# Altium schematic symbol library BARKO_SCHLIB.SchLib: 1064 symbols (part 10 of 11) (continued)
## R-150R-1206 (continued)
RES SMD 150 OHM 1% 1/4W 1206; Manufacturer: Stackpole Electronics; Manufacturer Part Number: RMCF1206FT150R; .PCBCHK: USED; .Creator: F:TALI; Washability: OK; Max Power Dissipation: 250mW; Temperature Coefficient: 100ppm/°C; ComponentLink1URL: http://www.vishay.com/docs/20008/dcrcw.pdf; ComponentLink1Description: http://www.vishay.com/docs/20008/dcrcw.pdf; ComponentLink2URL: http://documents.rs-components.com/techlib://itc_doclist_GB.htm?stockno=6180281; ComponentLink2Description: http://documents.rs-components.com/techlib://itc_doclist_GB.htm?stockno=6180281; ComponentLink3URL: http://www.farnell.com/datasheets/444357.pdf; ComponentLink3Description: http://www.farnell.com/datasheets/444357.pdf; ComponentLink4URL: http://www.farnell.com/datasheets/426256.pdf; ComponentLink4Description: http://www.farnell.com/datasheets/426256.pdf; ComponentLink5URL: http://www.mouser.com/ds/2/315/AOA0000C283-1093288.pdf; ComponentLink5Description: http://www.mouser.com/ds/2/315/AOA0000C283-1093288.pdf; ComponentLink6URL: http://www.farnell.com/datasheets/1678782.pdf; ComponentLink6Description: http://www.farnell.com/datasheets/1678782.pdf; ComponentLink7URL: http://industrial.panasonic.com/www-data/pdf/AOA0000/AOA0000CE2.pdf; ComponentLink7Description: http://industrial.panasonic.com/www-data/pdf/AOA0000/AOA0000CE2.pdf; ComponentLink8URL: https://www.alliedelec.com/m/d/623f45ff1957d936ff56d46fd1c28cac.pdf; ComponentLink8Description: https://www.alliedelec.com/m/d/623f45ff1957d936ff56d46fd1c28cac.pdf; .SCHCHK: USED; Supplier 1: Digi-Key; Supplier Part Number 1: RMCF1206FT150RCT-ND; Stock: 77607; Pricing: 1=0.1, 10=0.031, 100=0.0127, 1000=0.0057, 2500=0.0049 (USD); RoHS: Yes; Mount: Surface Mount; Case/Package: 1206; Contact Plating: Tin,Matte; Case Code (Metric): 3216; Min Operating Temperature: -55°C; Max Operating Temperature: 155°C; Resistor Type: Thick Film; Number of Terminations: 2; Tolerance: 1%; Packaging: Tape and Reel; Resistance: 150R; Features: Automotive AEC-Q200; Length: 0.126inch; Height: 0.028inch; Depth: 1.6mm; Width: 0.063inch; Radiation Hardening: No; Military Standard: Not; ComponentLink9URL: http://components.arrow.com/part/dataview/44988367S7171880N1174?src-supplier=Arrow+Electronics; ComponentLink9Description: http://components.arrow.com/part/dataview/44988367S7171880N1174?src-supplier=Arrow+Electronics; ComponentLink10URL: https://www.seielect.com/Catalog/SEI-RMCF_RMCP.pdf?src-supplier=Digi-Key; ComponentLink10Description: https://www.seielect.com/Catalog/SEI-RMCF_RMCP.pdf?src-supplier=Digi-Key; ComponentLink11URL: https://www.seielect.com/catalog/SEI-Packaging.pdf?src-supplier=Digi-Key; ComponentLink11Description: https://www.seielect.com/catalog/SEI-Packaging.pdf?src-supplier=Digi-Key; ComponentLink12URL: https://www.seielect.com/catalog/SEI-RMCF_RMCP.pdf?src-supplier=Avnet; ComponentLink12Description: https://www.seielect.com/catalog/SEI-RMCF_RMCP.pdf?src-supplier=Avnet; ComponentLink13URL: https://www.verical.com/server-webapp/html/getDatasheet?partID=366466&src-supplier=Verical; ComponentLink13Description: https://www.verical.com/server-webapp/html/getDatasheet?partID=366466&src-supplier=Verical
footprint R-1206
pins: 1, 2

## R-180R-0603
designator R?, comment 180R  Case Code (Imperial): 0603
RES SMD 180 OHM 1% 1/8W 0603; Manufacturer: Stackpole Electronics; Manufacturer Part Number: RNCP0603FTD180R; Max Power Dissipation: 125mW; Temperature Coefficient: 100ppm/°C; .PCBCHK: USED; .Creator: F:TALI; Washability: OK; Stock 1: 2901; Pricing 1: 1=0.1, 10=0.067, 100=0.0273, 1000=0.01224, 2500=0.01063 (USD); Mount: Surface Mount; Case/Package: 0603; Case Code (Metric): 1608; Min Operating Temperature: -55°C; Max Operating Temperature: 155°C; Resistance: 180R; Tolerance: 1%; Packaging: Tape and Reel; Composition: Thin Film; Number of Terminations: 2; Features: Anti-Sulfur,Moisture Resistant; Length: 0.059inch; Height: 0.02inch; Width: 0.031inch; Stock 2: 19504; Pricing 2: 1=0.18, 10=0.152, 100=0.0596, 1000=0.02495, 2500=0.02287 (USD); Contact Plating: Tin; Package Quantity: 5000; Military Standard: Not; Depth: 0.85mm; Radiation Hardening: No; Lead Free: Lead Free; ComponentLink1URL: http://www.vishay.com/docs/28705/mc_pro.pdf; ComponentLink1Description: http://www.vishay.com/docs/28705/mc_pro.pdf; .SCHCHK: USED; Supplier 1: Digi-Key; Supplier Part Number 1: RNCP0603FTD180RDKR-ND
footprint R-0603
pins: 1, 2

## R-182K-0603
designator R?, comment 180K  Case Code (Imperial): 0603
RES SMD 182K OHM 1% 1/10W 0603; Manufacturer: Panasonic; Manufacturer Part Number: ERJ-3EKF1823V; Resistance: 182kR; Temperature Coefficient: 100ppm/°C; Max Power Dissipation: 100mW; Voltage Rating (DC): 50V; Voltage Rating: 75V; .PCBCHK: USED; .Creator: F:TALI; Washability: OK; Stock 1: 134551; Pricing 1: 1=0.1, 10=0.065, 100=0.0264, 1000=0.01186, 2500=0.01029 (USD); Mount: Surface Mount; Case/Package: 0603; Case Code (Metric): 1608; Contact Plating: Tin; Min Operating Temperature: -55°C; Max Operating Temperature: 155°C; Tolerance: 1%; Packaging: Tape and Reel; Package Quantity: 1; Composition: Thick Film; Number of Terminations: 2; Features: Automotive AEC-Q200; Power Rating: 100mW; Military Standard: Not; Termination: SMD/SMT; Length: 1.6mm; Height: 0.022inch; Width: 0.031inch; Depth: 0.8mm; Lead Free: Lead Free; REACH SVHC: No SVHC; ComponentLink1URL: http://www.mouser.com/ds/2/315/AOA0000CE2-37512.pdf; ComponentLink1Description: http://www.mouser.com/ds/2/315/AOA0000CE2-37512.pdf; ComponentLink2URL: http://www.farnell.com/datasheets/1911175.pdf; ComponentLink2Description: http://www.farnell.com/datasheets/1911175.pdf; ComponentLink3URL: https://www.alliedelec.com/m/d/623f45ff1957d936ff56d46fd1c28cac.pdf; ComponentLink3Description: https://www.alliedelec.com/m/d/623f45ff1957d936ff56d46fd1c28cac.pdf; ComponentLink4URL: http://www.farnell.com/datasheets/426256.pdf; ComponentLink4Description: http://www.farnell.com/datasheets/426256.pdf; ComponentLink5URL: http://www.farnell.com/datasheets/1678782.pdf; ComponentLink5Description: http://www.farnell.com/datasheets/1678782.pdf; Stock 2: 550; Pricing 2: 1=0.1, 10=0.011, 100=0.0043 (USD); ComponentLink6URL: http://rohmfs.rohm.com/en/products/databook/datasheet/passive/resistor/chip_resistor/mcr_g.pdf; ComponentLink6Description: http://rohmfs.rohm.com/en/products/databook/datasheet/passive/resistor/chip_resistor/mcr_g.pdf; Stock 3: 0; Pricing 3: 1=0.1, 10=0.026, 100=0.0107, 1000=0.00478, 2500=0.00415 (USD); ComponentLink7URL: http://www.yageo.com/documents/recent/PYu-RC_Group_51_RoHS_L_9.pdf; ComponentLink7Description: http://www.yageo.com/documents/recent/PYu-RC_Group_51_RoHS_L_9.pdf; ComponentLink8URL: https://www.verical.com/server-webapp/html/getDatasheet?partID=328148; ComponentLink8Description: https://www.verical.com/server-webapp/html/getDatasheet?partID=328148; ComponentLink9URL: http://www.mouser.com/catalog/specsheets/RC0603.pdf; ComponentLink9Description: http://www.mouser.com/catalog/specsheets/RC0603.pdf; .SCHCHK: USED; Supplier 1: Digi-Key; Supplier Part Number 1: P182KHDKR-ND
footprint R-0603
pins: 1, 2

## R-200K-0603
designator R?, comment 200K  Tolerance: 1%  Case/Package: 0603
RES 200K OHM 1% 1/10W 0603; Manufacturer: Stackpole Electronics; Manufacturer Part Number: RMCF0603FT200K; Temperature Coefficient: 100ppm/°C; Resistance: 200kR; Power Rating: 100mW; Supplier 1: Digi-Key; Supplier Part Number 1: RMCF0603FT200KCT-ND; Stock: 196828; Pricing: 1=0.1, 10=0.015, 100=0.0063, 1000=0.0028, 2500=0.0024 (USD); RoHS: Yes; Mount: Surface Mount; Case Code (Imperial): 0603; Contact Plating: Tin,Matte; Min Operating Temperature: -55°C; Max Operating Temperature: 155°C; Composition: Thick Film; Number of Terminations: 2; Military Standard: Not; Packaging: Tape and Reel; Features: Automotive AEC-Q200; Max Power Dissipation: 100mW; Length: 1.55mm; Height: 0.022inch; Depth: 0.8mm; Width: 0.031inch; Radiation Hardening: No; Lead Free: Lead Free; ComponentLink1URL: https://datasheet.ciiva.com/15193/getdatasheetpartid-369944-15193452.pdf?src-supplier=Verical; ComponentLink1Description: https://datasheet.ciiva.com/15193/getdatasheetpartid-369944-15193452.pdf?src-supplier=Verical; Case Code (Metric): 1608
footprint R-0603
pins: 1, 2

## R-200K-0805
designator R?, comment 200K  Case/Package: 0805
RES 200K OHM 1% 1/8W 0805; Manufacturer 1: Stackpole Electronics; Manufacturer Part Number: RMCF0805FT200K; Working Voltage: 150V; Resistance: 200kR; Power Rating: 125mW; Temperature Coefficient: 100ppm/°C; .Creator: M.OZKAN; .PCBCHK: USED; Supplier 1: Digi-Key; Supplier Part Number 1: RMCF0805FT200KCT-ND; RoHS: Yes; Category: Chip SMD Resistors; Stock: 131806; Pricing: 1=0,10000, 10=0,02600, 100=0,01040, 1000=0,00466, 2500=0,00405 (USD); Mount: Surface Mount; Case Code (Imperial): 0805; Case Code (Metric): 2012; Contact Plating: Tin,Matte; Min Operating Temperature: -55°C; Max Operating Temperature: 155°C; Composition: Thick Film; Number of Terminations: 2; Military Standard: Not; Packaging: Tape and Reel; Features: Automotive AEC-Q200; Tolerance: 1%; Max Power Dissipation: 125mW; Length: 2mm; Height: 0.026inch; Depth: 1.25mm; Width: 0.049inch; Radiation Hardening: No; Lead Free: Lead Free; ComponentLink1URL: http://components.arrow.com/part/dataview/43746279S7171769N1174?src-supplier=Arrow; ComponentLink1Description: http://components.arrow.com/part/dataview/43746279S7171769N1174?src-supplier=Arrow; ComponentLink2URL: https://www.verical.com/server-webapp/html/getDatasheet?partID=364258&src-supplier=Verical; ComponentLink2Description: https://www.verical.com/server-webapp/html/getDatasheet?partID=364258&src-supplier=Verical; ComponentLink3URL: http://www.seielect.com/Catalog/SEI-RMC.pdf?src-supplier=Future+Electronics; ComponentLink3Description: http://www.seielect.com/Catalog/SEI-RMC.pdf?src-supplier=Future+Electronics; ComponentLink4URL: https://www.seielect.com/catalog/SEI-Packaging.pdf?src-supplier=Digi-Key; ComponentLink4Description: https://www.seielect.com/catalog/SEI-Packaging.pdf?src-supplier=Digi-Key; ComponentLink5URL: https://www.seielect.com/catalog/SEI-RMCF_RMCP.pdf?src-supplier=Avnet; ComponentLink5Description: https://www.seielect.com/catalog/SEI-RMCF_RMCP.pdf?src-supplier=Avnet; .SCHCHK: USED
footprint R-0805
pins: 1, 2

## R-200U-3920
designator R?, comment 200U  Tolerance: 1%  Case/Package: 3920
RES SMD 200 UOHM 1% 12W 3920; Manufacturer: Bourns; Manufacturer Part Number: CSS2H-3920R-L200F; Resistance: 0.2mR; Temperature Coefficient: 50ppm/°C; Supplier 1: Digi-Key; Supplier Part Number 1: CSS2H-3920R-L200FCT-ND; Stock: 8453; Pricing: 1=1.52, 10=1.342, 25=1.234, 50=1.1258, 100=0.9743, 250=0.8227, 500=0.6928, 1000=0.5889 (USD); RoHS: Yes; Case Code (Metric): 1052; Case Code (Imperial): 3920; Min Operating Temperature: -55°C; Max Operating Temperature: 170°C; Number of Terminations: 2; Max Power Dissipation: 12W; Features: Moisture Resistant; Packaging: Cut Tape; Power Rating: 12W; Resistor Type: Metal Element,Metal Strip; Length: 0.394inch; Height: 0.051inch; Width: 0.205inch; REACH SVHC: No SVHC; ComponentLink1URL: http://www.farnell.com/datasheets/2058209.pdf?src-supplier=Farnell; ComponentLink1Description: http://www.farnell.com/datasheets/2058209.pdf?src-supplier=Farnell; ComponentLink2URL: http://www.mouser.com/ds/2/54/ss2h-3920-935112.pdf?src-supplier=Mouser; ComponentLink2Description: http://www.mouser.com/ds/2/54/ss2h-3920-935112.pdf?src-supplier=Mouser; ComponentLink3URL: http://www.farnell.com/datasheets/2058209.pdf?src-supplier=Element14; ComponentLink3Description: http://www.farnell.com/datasheets/2058209.pdf?src-supplier=Element14; ComponentLink4URL: http://www.bourns.com/docs/Product-Datasheets/css2h-3920.pdf?src-supplier=Digi-Key; ComponentLink4Description: http://www.bourns.com/docs/Product-Datasheets/css2h-3920.pdf?src-supplier=Digi-Key; ComponentLink5URL: https://www.bourns.com/docs/Product-Datasheets/css2h-3920.pdf?src-supplier=Digi-Key; ComponentLink5Description: https://www.bourns.com/docs/Product-Datasheets/css2h-3920.pdf?src-supplier=Digi-Key
footprint R-3920
pins: 1, 2

## R-210K-0603
designator R?, comment 210K  Tolerance: 1%  Case/Package: 0603
RES 210K OHM 1% 1/10W 0603; Manufacturer: Stackpole Electronics; Manufacturer Part Number: RMCF0603FT210K; Resistance: 210kR; Temperature Coefficient: 100ppm/°C; Max Power Dissipation: 100mW; Washability: OK; .Creator: M.OZKAN; .PCBCHK: USED; RoHS: Yes; Mount: Surface Mount; Case Code (Metric): 1608; Case Code (Imperial): 0603; Contact Plating: Tin,Matte; Min Operating Temperature: -55°C; Max Operating Temperature: 155°C; Composition: Thick Film; Packaging: Tape and Reel; Number of Terminations: 2; Features: Automotive AEC-Q200; Power Rating: 100mW; Package Quantity: 1; Length: 0.061inch; Height: 0.022inch; Width: 0.031inch; Radiation Hardening: No; Lead Free: Lead Free; ComponentLink1URL: http://www.seielect.com/Catalog/SEI-RMC.pdf?src-supplier=Future+Electronics; ComponentLink1Description: http://www.seielect.com/Catalog/SEI-RMC.pdf?src-supplier=Future+Electronics; ComponentLink2URL: https://www.seielect.com/catalog/SEI-Packaging.pdf?src-supplier=Digi-Key; ComponentLink2Description: https://www.seielect.com/catalog/SEI-Packaging.pdf?src-supplier=Digi-Key; ComponentLink3URL: https://www.seielect.com/catalog/SEI-RMCF_RMCP.pdf?src-supplier=Avnet; ComponentLink3Description: https://www.seielect.com/catalog/SEI-RMCF_RMCP.pdf?src-supplier=Avnet; Supplier 1: Avnet; Supplier Part Number 1: RMCF0603FT40K2; Stock 1: 0; Pricing 1: 65000=0.00184, 75000=0.00182, 140000=0.00177, 325000=0.00173, 650000=0.00169 (USD); ComponentLink4URL: http://components.arrow.com/part/dataview/47804758S9848883N1174?src-supplier=Arrow; ComponentLink4Description: http://components.arrow.com/part/dataview/47804758S9848883N1174?src-supplier=Arrow; ComponentLink5URL: https://www.seielect.com/catalog/SEI-RMCF_RMCP.pdf?src-supplier=Avnet+Asia; ComponentLink5Description: https://www.seielect.com/catalog/SEI-RMCF_RMCP.pdf?src-supplier=Avnet+Asia; .SCHCHK: USED
footprint R-0603
pins: 1, 2

## R-215R-0603-0.1
designator R?, comment 215R  Case/Package: 0603  Tolerance: 0.1%
RES SMD 215 OHM 0.1% 1/5W 0603; Manufacturer: Panasonic; Manufacturer Part Number: ERJ-PB3B2150V; Max Power Dissipation: 200mW; Temperature Coefficient: 50ppm/°C; Supplier 1: Digi-Key; Supplier Part Number 1: P19893CT-ND; Stock: 4851; Pricing: 1=0.23, 10=0.191, 25=0.1392, 50=0.101, 100=0.0748, 250=0.0574, 500=0.0452, 1000=0.0313 (USD); RoHS: Yes; Case Code (Imperial): 0603; Case Code (Metric): 1608; Min Operating Temperature: -55°C; Max Operating Temperature: 155°C; Packaging: Tape and Reel; Resistance: 215R; Resistor Type: Thick Film; Number of Terminations: 2; Features: Automotive AEC-Q200; Length: 0.063inch; Width: 0.032inch; Height - Seated (Max): 0.022inch; ComponentLink1URL: https://industrial.panasonic.com/cdbs/www-data/pdf/RDM0000/DMM0000COL5.pdf?src-supplier=Digi-Key; ComponentLink1Description: https://industrial.panasonic.com/cdbs/www-data/pdf/RDM0000/DMM0000COL5.pdf?src-supplier=Digi-Key; ComponentLink2URL: https://industrial.panasonic.com/sa/system/files/data/download/catalog/id_fixed-resistors_e_2.pdf?src-supplier=Digi-Key; ComponentLink2Description: https://industrial.panasonic.com/sa/system/files/data/download/catalog/id_fixed-resistors_e_2.pdf?src-supplier=Digi-Key
footprint R-0603
pins: 1, 2

## R-220K-0402
designator R?, comment 220K  Case/Package: 0402
RES SMD 220K OHM 1% 1/10W 0402; Manufacturer: Vishay BCcomponents; Manufacturer Part Number: MCS04020C2203FE000; Resistance: 270R; Temperature Coefficient: 50ppm/°C; Max Power Dissipation: 100mW; Voltage Rating: 50V; .PCBCHK: USED; .Creator: F:TALI; Washability: OK; Stock 1: 60942; Pricing 1: 1=0.3, 10=0.254, 100=0.0993, 1000=0.04158, 2500=0.03812, 5000=0.03465 (USD); Contact Plating: Tin; Min Operating Temperature: -55°C; Max Operating Temperature: 125°C; Tolerance: 1%; Composition: Thin Film; Packaging: Tape and Reel; Military Standard: Not; Length: 1mm; Width: 500um; Depth: 0.5mm; Radiation Hardening: No; Lead Free: Lead Free; ComponentLink1URL: http://www.vishay.com/docs/28705/mc_pro.pdf; ComponentLink1Description: http://www.vishay.com/docs/28705/mc_pro.pdf; Stock 2: 1223696; Pricing 2: 1=0.1, 10=0.031, 100=0.0125, 1000=0.0056, 2500=0.00486, 5000=0.00401 (USD); Mount: Surface Mount; Case Code (Imperial): 0402; Case Code (Metric): 1005; Package Quantity: 1; Number of Terminations: 2; Power Rating: 100mW; Features: Automotive AEC-Q200; Voltage Rating (DC): 50V; Termination: SMD/SMT; Height: 0.35mm; REACH SVHC: No SVHC; ComponentLink2URL: http://www.farnell.com/datasheets/1500035.pdf; ComponentLink2Description: http://www.farnell.com/datasheets/1500035.pdf; ComponentLink3URL: http://www.mouser.com/ds/2/315/AOA0000C84-947596.pdf; ComponentLink3Description: http://www.mouser.com/ds/2/315/AOA0000C84-947596.pdf; ComponentLink4URL: https://www.alliedelec.com/m/d/51cd0790071e1666bdb9d00c57fcf960.pdf; ComponentLink4Description: https://www.alliedelec.com/m/d/51cd0790071e1666bdb9d00c57fcf960.pdf; ComponentLink5URL: http://industrial.panasonic.com/www-data/pdf/AOA0000/AOA0000CE1.pdf; ComponentLink5Description: http://industrial.panasonic.com/www-data/pdf/AOA0000/AOA0000CE1.pdf; Stock 3: 15182; Pricing 3: 1=0.15, 10=0.125, 100=0.0491, 1000=0.02053, 2500=0.01882, 5000=0.01711 (USD); ComponentLink6URL: http://www.farnell.com/datasheets/1678782.pdf; ComponentLink6Description: http://www.farnell.com/datasheets/1678782.pdf; ComponentLink7URL: https://www.alliedelec.com/m/d/623f45ff1957d936ff56d46fd1c28cac.pdf; ComponentLink7Description: https://www.alliedelec.com/m/d/623f45ff1957d936ff56d46fd1c28cac.pdf; ComponentLink8URL: http://industrial.panasonic.com/www-data/pdf/AOA0000/AOA0000CE2.pdf; ComponentLink8Description: http://industrial.panasonic.com/www-data/pdf/AOA0000/AOA0000CE2.pdf; ComponentLink9URL: http://www.mouser.com/ds/2/315/AOA0000CE2-37512.pdf; ComponentLink9Description: http://www.mouser.com/ds/2/315/AOA0000CE2-37512.pdf; ComponentLink10URL: http://www.farnell.com/datasheets/1694929.pdf; ComponentLink10Description: http://www.farnell.com/datasheets/1694929.pdf; .SCHCHK: USED; Supplier 1: Digi-Key; Supplier Part Number 1: 749-1566-6-ND
footprint R-0402
pins: 1, 2

## R-220K-0603
designator R?, comment 220K  Case Code (Imperial): 0603
RES SMD 220K OHM 5% 1/10W 0603; Manufacturer: Yageo; Manufacturer Part Number: RC0603JR-07220KL; Resistance: 220kR; Temperature Coefficient: 100ppm/°C; Voltage Rating (DC): 50V; Power Rating: 100mW; .PCBCHK: USED; .Creator: F:TALI; Washability: OK; Stock 1: 821358; Pricing 1: 1=0.1, 10=0.022, 100=0.0088, 1000=0.00396, 2500=0.00344 (USD); Case/Package: 0603; Number of Pins: 2; Case Code (Metric): 1608; Min Operating Temperature: -55°C; Max Operating Temperature: 155°C; Tolerance: 5%; Composition: Thick Film; Packaging: Tape and Reel; Voltage Rating: 50V; Package Quantity: 1; Termination: SMD/SMT; Number of Terminations: 2; Military Standard: Not; Max Power Dissipation: 100mW; Features: Moisture Resistant; Length: 1.6mm; Height: 0.022inch; Width: 0.031inch; Depth: 0.8mm; REACH SVHC: No SVHC; Lead Free: Lead Free; ComponentLink1URL: http://www.yageo.com/documents/recent/PYu-RC_Group_51_RoHS_L_9.pdf; ComponentLink1Description: http://www.yageo.com/documents/recent/PYu-RC_Group_51_RoHS_L_9.pdf; Mount: Surface Mount; Weight: 7.1E-05oz; Contact Plating: Tin; Radiation Hardening: No; ComponentLink2URL: https://www.verical.com/server-webapp/html/getDatasheet?partID=52011; ComponentLink2Description: https://www.verical.com/server-webapp/html/getDatasheet?partID=52011; ComponentLink3URL: http://industrial.panasonic.com/www-data/pdf/AOA0000/AOA0000CE1.pdf; ComponentLink3Description: http://industrial.panasonic.com/www-data/pdf/AOA0000/AOA0000CE1.pdf; ComponentLink4URL: http://www.farnell.com/datasheets/2059623.pdf; ComponentLink4Description: http://www.farnell.com/datasheets/2059623.pdf; ComponentLink5URL: http://www.farnell.com/datasheets/1678796.pdf; ComponentLink5Description: http://www.farnell.com/datasheets/1678796.pdf; ComponentLink6URL: http://www.jameco.com/Jameco/Products/ProdDS/1988621.pdf; ComponentLink6Description: http://www.jameco.com/Jameco/Products/ProdDS/1988621.pdf; ComponentLink7URL: https://www.alliedelec.com/m/d/51cd0790071e1666bdb9d00c57fcf960.pdf; ComponentLink7Description: https://www.alliedelec.com/m/d/51cd0790071e1666bdb9d00c57fcf960.pdf; Thickness: 457um; ComponentLink8URL: http://www.bourns.com/pdfs/chpreztr.pdf; ComponentLink8Description: http://www.bourns.com/pdfs/chpreztr.pdf; ComponentLink9URL: http://www.bourns.com/docs/Product-Datasheets/CHPREZTR.pdf; ComponentLink9Description: http://www.bourns.com/docs/Product-Datasheets/CHPREZTR.pdf; Stock 2: 1784318; Pricing 2: 1=0.1, 10=0.065, 100=0.0264, 1000=0.01186, 2500=0.01029 (USD); ComponentLink10URL: http://industrial.panasonic.com/www-data/pdf/AOA0000/AOA0000CE2.pdf; ComponentLink10Description: http://industrial.panasonic.com/www-data/pdf/AOA0000/AOA0000CE2.pdf; ComponentLink11URL: https://www.alliedelec.com/m/d/623f45ff1957d936ff56d46fd1c28cac.pdf; ComponentLink11Description: https://www.alliedelec.com/m/d/623f45ff1957d936ff56d46fd1c28cac.pdf; ComponentLink12URL: http://www.farnell.com/datasheets/1911175.pdf; ComponentLink12Description: http://www.farnell.com/datasheets/1911175.pdf; ComponentLink13URL: http://www.farnell.com/datasheets/1678782.pdf; ComponentLink13Description: http://www.farnell.com/datasheets/1678782.pdf; ComponentLink14URL: http://www.farnell.com/datasheets/426256.pdf; ComponentLink14Description: http://www.farnell.com/datasheets/426256.pdf; ComponentLink15URL: http://www.mouser.com/ds/2/315/AOA0000CE2-37512.pdf; ComponentLink15Description: http://www.mouser.com/ds/2/315/AOA0000CE2-37512.pdf; Stock 3: 189171; Pricing 3: 1=0.1, 10=0.028, 100=0.0113, 1000=0.00507, 2500=0.0044 (USD); ComponentLink16URL: http://www.samsungsem.com/kr/support/library/product-catalog/__icsFiles/afieldfile/2015/09/22/CHIP_RESISTOR_2015.pdf; ComponentLink16Description: http://www.samsungsem.com/kr/support/library/product-catalog/__icsFiles/afieldfile/2015/09/22/CHIP_RESISTOR_2015.pdf; .SCHCHK: USED; Supplier 1: Digi-Key; Supplier Part Number 1: 311-220KGRDKR-ND
footprint R-0603
pins: 1, 2

## R-220R-0402
designator R?, comment 220R  Case/Package: 0402
RES 220 OHM 5% 1/16W 0402; Manufacturer: Stackpole Electronics; Manufacturer Part Number: RMCF0402JT220R; Power Rating: 63mW; Temperature Coefficient: 100ppm/°C; .Creator: F:TALI; .PCBCHK: USED; Washability: OK; Supplier 1: Digi-Key; Supplier Part Number 1: RMCF0402JT220RDKR-ND; Stock 1: 673587; Pricing 1: 1=0.1, 10=0.012, 100=0.005, 1000=0.00224, 2500=0.00195, 5000=0.00161 (USD); Mount: Surface Mount; Case Code (Metric): 1005; Contact Plating: Matte,Tin; Min Operating Temperature: -55°C; Max Operating Temperature: 155°C; Packaging: Tape and Reel; Resistance: 220R; Tolerance: 5%; Composition: Thick Film; Number of Terminations: 2; Military Standard: Not; Max Power Dissipation: 63mW; Features: Automotive AEC-Q200; Length: 0.039inch; Height: 0.016inch; Width: 0.02inch; Depth: 0.5mm; Lead Free: Lead Free; Case Code (Imperial): 0402; .SCHCHK: USED
footprint R-0402
pins: 1, 2

## R-220R-0805
designator R?, comment 220R  Case Code (Imperial): 0805
RES SMD 220 OHM 1% 1/8W 0805; Manufacturer: Bourns; Manufacturer Part Number: CR0805-FX-2200GLF; Power Rating: 125mW; Voltage Rating: 150V; Temperature Coefficient: 100ppm/°C; .Creator: F:TALI; .PCBCHK: USED; Washability: OK; Supplier 1: Digi-Key; Stock 1: 10000; Pricing 1: 10000=0.00327, 30000=0.00287 (USD); Mount: Surface Mount; Case/Package: 0805; Number of Pins: 2; Case Code (Metric): 2012; Contact Plating: Tin; Min Operating Temperature: -55°C; Max Operating Temperature: 155°C; Package Quantity: 10000; Packaging: Tape and Reel; Resistance: 220R; Tolerance: 1%; Composition: Thick Film; Termination: SMD/SMT; Number of Terminations: 2; Military Standard: Not; Max Power Dissipation: 125mW; Voltage Rating (DC): 150V; Features: Moisture Resistant; Length: 2mm; Height: 0.024inch; Width: 0.049inch; Depth: 1.25mm; Thickness: 508um; Radiation Hardening: No; REACH SVHC: No SVHC; ComponentLink1URL: https://www.alliedelec.com/m/d/8318635a9e5af6f7dacb272be3e73d2e.pdf; ComponentLink1Description: https://www.alliedelec.com/m/d/8318635a9e5af6f7dacb272be3e73d2e.pdf; ComponentLink2URL: http://www.farnell.com/datasheets/1902866.pdf; ComponentLink2Description: http://www.farnell.com/datasheets/1902866.pdf; ComponentLink3URL: http://uk.rs-online.com/webdocs/0fcd/0900766b80fcdb72.pdf; ComponentLink3Description: http://uk.rs-online.com/webdocs/0fcd/0900766b80fcdb72.pdf; ComponentLink4URL: http://www.bourns.com/docs/Product-Datasheets/CHPREZTR.pdf; ComponentLink4Description: http://www.bourns.com/docs/Product-Datasheets/CHPREZTR.pdf; ComponentLink5URL: http://www.farnell.com/datasheets/2016309.pdf; ComponentLink5Description: http://www.farnell.com/datasheets/2016309.pdf; ComponentLink6URL: https://www.bourns.com/docs/Product-Datasheets/CHPREZTR.pdf; ComponentLink6Description: https://www.bourns.com/docs/Product-Datasheets/CHPREZTR.pdf; Supplier Part Number 1: CR0805-FX-2200GLFTR-ND; .SCHCHK: USED
footprint R-0805
pins: 1, 2

## R-226K-0603
designator R?, comment 226K  Case Code (Imperial): 0603
RES SMD 226K OHM 1% 1/10W 0603; Manufacturer: Yageo; Manufacturer Part Number: RC0603FR-07226KL; Resistance: 226kR; Power Rating: 100mW; Voltage Rating: 50V; Temperature Coefficient: 100ppm/°C; .Creator: F:TALI; .PCBCHK: USED; Washability: OK; Supplier 1: Digi-Key; Stock 1: 408658; Pricing 1: 1=0.1, 10=0.024, 100=0.0097, 1000=0.00437, 2500=0.00379 (USD); Case/Package: 0603; Case Code (Metric): 1608; Min Operating Temperature: -55°C; Max Operating Temperature: 155°C; Tolerance: 1%; Packaging: Tape and Reel; Package Quantity: 1; Termination: SMD/SMT; Composition: Thick Film; Number of Terminations: 2; Military Standard: Not; Max Power Dissipation: 100mW; Voltage Rating (DC): 50V; Features: Moisture Resistant; Length: 1.6mm; Height: 0.022inch; Width: 0.031inch; Depth: 0.8mm; Lead Free: Lead Free; ComponentLink1URL: https://www.verical.com/server-webapp/html/getDatasheet?partID=32853; ComponentLink1Description: https://www.verical.com/server-webapp/html/getDatasheet?partID=32853; ComponentLink2URL: http://www.yageo.com/documents/recent/PYu-RC_Group_51_RoHS_L_9.pdf; ComponentLink2Description: http://www.yageo.com/documents/recent/PYu-RC_Group_51_RoHS_L_9.pdf; Supplier Part Number 1: 311-226KHRDKR-ND; .SCHCHK: USED
footprint R-0603
pins: 1, 2

## R-250R-0603
designator R?, comment 250R  Case/Package: 0603  Tolerance: 0.01%
RES 250 OHM 0.01% 1/10W 0603; Manufacturer: Stackpole Electronics; Manufacturer Part Number: RNCF0603TKY250R; Max Power Dissipation: 100mW; Temperature Coefficient: 5ppm/°C; Supplier 1: Digi-Key; Supplier Part Number 1: RNCF0603TKY250RCT-ND; Stock: 3231; Pricing: 1=1.86, 10=1.65, 100=1.26 (USD); RoHS: Yes; Mount: Surface Mount; Case Code (Imperial): 0603; Case Code (Metric): 1608; Min Operating Temperature: -55°C; Max Operating Temperature: 155°C; Features: Moisture Resistant; Packaging: Tape and Reel; Resistance: 250R; Resistor Type: Thin Film; Number of Terminations: 2; Length: 0.063inch; Height: 0.022inch; Width: 0.031inch; ComponentLink1URL: https://www.seielect.com/catalog/SEI-Packaging.pdf?src-supplier=Digi-Key; ComponentLink1Description: https://www.seielect.com/catalog/SEI-Packaging.pdf?src-supplier=Digi-Key
footprint R-0603
pins: 1, 2

## R-270K-0805
designator R?, comment 270K  Case/Package: 0805
RES SMD 270K OHM 1% 1/8W 0805; Manufacturer: TE Connectivity; Manufacturer Part Number: 1623168-1; Resistance: 270kR; Temperature Coefficient: 100ppm/°C; Max Power Dissipation: 125mW; Voltage Rating: 150V; .PCBCHK: USED; .Creator: F:TALI; Washability: OK; Mount: Surface Mount; Min Operating Temperature: -55°C; Max Operating Temperature: 125°C; Tolerance: 1%; Composition: Thick Film; Packaging: Tape and Reel; Number of Terminations: 2; Package Quantity: 5000; Military Standard: Not; Length: 0.079inch; Height: 0.026inch; Width: 0.049inch; Depth: 1.25mm; Radiation Hardening: No; ComponentLink1URL: http://www.te.com/commerce/DocumentDelivery/DDEController?Action=showdoc&DocId=Data+Sheet%7F1773204%7FF%7Fpdf%7FEnglish%7FENG_DS_1773204_F.pdf; ComponentLink1Description: http://www.te.com/commerce/DocumentDelivery/DDEController?Action=showdoc&DocId=Data+Sheet%7F1773204%7FF%7Fpdf%7FEnglish%7FENG_DS_1773204_F.pdf; ComponentLink2URL: http://www.te.com/commerce/DocumentDelivery/DDEController?Action=srchrtrv&DocNm=1773204&DocType=DS&DocLang=English; ComponentLink2Description: http://www.te.com/commerce/DocumentDelivery/DDEController?Action=srchrtrv&DocNm=1773204&DocType=DS&DocLang=English; Number of Pins: 2; Weight: 0.000194oz; Case Code (Metric): 2012; Case Code (Imperial): 0805; Contact Plating: Tin; Power Rating: 125mW; Termination: SMD/SMT; Features: Automotive AEC-Q200; Voltage Rating (DC): 150V; Working Voltage: 150V; Lead Free: Lead Free; REACH SVHC: No SVHC; ComponentLink3URL: http://www.farnell.com/datasheets/426256.pdf; ComponentLink3Description: http://www.farnell.com/datasheets/426256.pdf; ComponentLink4URL: https://industrial.panasonic.com/cdbs/www-data/pdf/RDA0000/DMA0000COL11.pdf; ComponentLink4Description: https://industrial.panasonic.com/cdbs/www-data/pdf/RDA0000/DMA0000COL11.pdf; ComponentLink5URL: https://industrial.panasonic.com/cdbs/www-data/pdf/RDA0000/AOA0000C304.pdf; ComponentLink5Description: https://industrial.panasonic.com/cdbs/www-data/pdf/RDA0000/AOA0000C304.pdf; ComponentLink6URL: http://www.farnell.com/datasheets/1678782.pdf; ComponentLink6Description: http://www.farnell.com/datasheets/1678782.pdf; ComponentLink7URL: http://www.yageo.com/NewPortal/yageodocoutput?fileName=/pdf/R-Chip/PYu-AC_51_RoHS_L_6.pdf; ComponentLink7Description: http://www.yageo.com/NewPortal/yageodocoutput?fileName=/pdf/R-Chip/PYu-AC_51_RoHS_L_6.pdf; Supplier 1: Digi-Key; Supplier Part Number 1: A126354DKR-ND; Stock 1: 6699; Pricing 1: 1=0.1, 10=0.049, 100=0.02, 1000=0.00898, 2500=0.00779 (USD); .SCHCHK: USED
footprint R-0805
pins: 1, 2

## R-270K-0805-0.5W
designator R?, comment 270K  Power Rating: 500mW  Case/Package: 0805
RES SMD 270K OHM 5% 1/2W 0805; Manufacturer: Panasonic; Manufacturer Part Number: ERJ-P06J274V; Voltage Rating (DC): 150V; Temperature Coefficient: 200ppm/°C; Resistance: 270kR; Supplier 1: Digi-Key; Supplier Part Number 1: P270KADCT-ND; Stock: 14220; Pricing: 1=0.1, 10=0.094, 100=0.036, 1000=0.0158, 2500=0.0137 (USD); RoHS: Yes; Mount: Surface Mount; Case Code (Metric): 2012; Case Code (Imperial): 0805; Contact Plating: Tin; Min Operating Temperature: -55°C; Max Operating Temperature: 155°C; Max Power Dissipation: 500mW; Features: Automotive AEC-Q200; Resistor Type: Thick Film; Number of Terminations: 2; Termination: SMD/SMT; Packaging: Tape and Reel; Tolerance: 5%; Package Quantity: 1; Voltage Rating: 150V; Length: 0.079inch; Height: 0.028inch; Width: 0.049inch; Radiation Hardening: No; Lead Free: Contains Lead; ComponentLink1URL: https://datasheet.ciiva.com/9183/aoa0000ce4-9183725.pdf?src-supplier=Avnet; ComponentLink1Description: https://datasheet.ciiva.com/9183/aoa0000ce4-9183725.pdf?src-supplier=Avnet; ComponentLink2URL: https://datasheet.ciiva.com/24070/aoa0000ce4-64075-24070088.pdf?src-supplier=Mouser; ComponentLink2Description: https://datasheet.ciiva.com/24070/aoa0000ce4-64075-24070088.pdf?src-supplier=Mouser; ComponentLink3URL: https://datasheet.ciiva.com/17206/aoa0000ce4-17206603.pdf?src-supplier=Avnet+Europe; ComponentLink3Description: https://datasheet.ciiva.com/17206/aoa0000ce4-17206603.pdf?src-supplier=Avnet+Europe
footprint R-0805
pins: 1, 2

## R-287K-0603
designator R?, comment 287K  Case/Package: 0603  Tolerance: 1%
RES 287K OHM 1% 1/10W 0603; Manufacturer: Stackpole Electronics; Manufacturer Part Number: RMCF0603FT287K; Max Power Dissipation: 100mW; Temperature Coefficient: 100ppm/°C; Resistance: 287kR; .Creator: M.OZKAN; .PCBCHK: USED; Supplier 1: Digi-Key; Supplier Part Number 1: RMCF0603FT287KCT-ND; Stock: 17637; Pricing: 1=0.1, 10=0.016, 100=0.0065, 1000=0.0029, 2500=0.0025 (USD); RoHS: Yes; Mount: Surface Mount; Contact Plating: Tin,Matte; Case Code (Metric): 1608; Case Code (Imperial): 0603; Min Operating Temperature: -55°C; Max Operating Temperature: 155°C; Composition: Thick Film; Number of Terminations: 2; Power Rating: 100mW; Packaging: Tape and Reel; Features: Automotive AEC-Q200; Length: 0.061inch; Height: 0.022inch; Width: 0.031inch; Radiation Hardening: No; Lead Free: Lead Free; ComponentLink1URL: https://www.seielect.com/catalog/SEI-RMCF_RMCP.pdf?src-supplier=Avnet+Asia; ComponentLink1Description: https://www.seielect.com/catalog/SEI-RMCF_RMCP.pdf?src-supplier=Avnet+Asia; ComponentLink2URL: https://www.seielect.com/Catalog/SEI-RMCF_RMCP.pdf?src-supplier=Digi-Key; ComponentLink2Description: https://www.seielect.com/Catalog/SEI-RMCF_RMCP.pdf?src-supplier=Digi-Key; ComponentLink3URL: https://www.seielect.com/catalog/SEI-RMCF_RMCP.pdf?src-supplier=Avnet; ComponentLink3Description: https://www.seielect.com/catalog/SEI-RMCF_RMCP.pdf?src-supplier=Avnet; ComponentLink4URL: https://www.seielect.com/catalog/SEI-Packaging.pdf?src-supplier=Digi-Key; ComponentLink4Description: https://www.seielect.com/catalog/SEI-Packaging.pdf?src-supplier=Digi-Key; .SCHCHK: USED
footprint R-0603
pins: 1, 2

## R-324K-0603
designator R?, comment 324K  Case/Package: 0603
RES 324K OHM 1/10W 1% 0603; Manufacturer: Stackpole Electronics; Manufacturer Part Number: RMCF0603FT324K; Max Power Dissipation: 100mW; Temperature Coefficient: 100ppm/°C; Resistance: 324kR; .Creator: M.OZKAN; .PCBCHK: USED; Stock: 4430; Pricing: 1=0.1, 10=0.016, 100=0.0065, 1000=0.0029, 2500=0.0025 (USD); RoHS: Yes; Mount: Surface Mount; Contact Plating: Tin,Matte; Case Code (Metric): 1608; Case Code (Imperial): 0603; Min Operating Temperature: -55°C; Max Operating Temperature: 155°C; Features: Automotive AEC-Q200; Composition: Thick Film; Number of Terminations: 2; Package Quantity: 5000; Packaging: Tape and Reel; Tolerance: 1%; Length: 0.061inch; Height: 0.022inch; Width: 0.031inch; Radiation Hardening: No; Lead Free: Contains Lead; ComponentLink1URL: https://www.seielect.com/catalog/sei-rmcf_rmcp.pdf?src-supplier=Digi-Key; ComponentLink1Description: https://www.seielect.com/catalog/sei-rmcf_rmcp.pdf?src-supplier=Digi-Key; ComponentLink2URL: https://www.seielect.com/catalog/SEI-RMCF_RMCP.pdf?src-supplier=Avnet; ComponentLink2Description: https://www.seielect.com/catalog/SEI-RMCF_RMCP.pdf?src-supplier=Avnet; ComponentLink3URL: https://www.seielect.com/catalog/SEI-Packaging.pdf?src-supplier=Digi-Key; ComponentLink3Description: https://www.seielect.com/catalog/SEI-Packaging.pdf?src-supplier=Digi-Key; .SCHCHK: USED; Supplier 1: Digi-Key; Supplier Part Number 1: 738-RMCF0603FT324KCT-ND; Resistor Type: Thick Film
footprint R-0603
pins: 1, 2

## R-330K-0603
designator R?, comment 330K  Case Code (Imperial): 0603
RES SMD 330K OHM 5% 1/10W 0603; Manufacturer: Yageo; Manufacturer Part Number: RC0603JR-07330KL; Resistance: 330kR; Power Rating: 100mW; Voltage Rating: 75V; Voltage Rating (DC): 50V; Temperature Coefficient: 100ppm/°C; .PCBCHK: USED; .Creator: F:TALI; Washability: OK; Stock 1: 260843; Pricing 1: 1=0.1, 10=0.022, 100=0.0088, 1000=0.00396, 2500=0.00344 (USD); Case/Package: 0603; Number of Pins: 2; Weight: 7.1E-05oz; Case Code (Metric): 1608; Min Operating Temperature: -55°C; Max Operating Temperature: 155°C; Tolerance: 5%; Packaging: Tape and Reel; Package Quantity: 1; Termination: SMD/SMT; Composition: Thick Film; Number of Terminations: 2; Military Standard: Not; Max Power Dissipation: 100mW; Features: Moisture Resistant; Length: 1.6mm; Height: 0.022inch; Width: 0.8mm; Depth: 0.8mm; REACH SVHC: No SVHC; Lead Free: Lead Free; ComponentLink1URL: http://www.yageo.com/documents/recent/PYu-RC_Group_51_RoHS_L_9.pdf; ComponentLink1Description: http://www.yageo.com/documents/recent/PYu-RC_Group_51_RoHS_L_9.pdf; ComponentLink2URL: http://www.farnell.com/datasheets/443971.pdf; ComponentLink2Description: http://www.farnell.com/datasheets/443971.pdf; ComponentLink3URL: https://www.verical.com/server-webapp/html/getDatasheet?partID=323834; ComponentLink3Description: https://www.verical.com/server-webapp/html/getDatasheet?partID=323834; Stock 2: 482416; Pricing 2: 1=0.1, 10=0.043, 100=0.0176, 1000=0.00791, 2500=0.00686 (USD); Mount: Surface Mount; Contact Plating: Tin; ComponentLink4URL: http://www.farnell.com/datasheets/1678796.pdf; ComponentLink4Description: http://www.farnell.com/datasheets/1678796.pdf; ComponentLink5URL: http://industrial.panasonic.com/www-data/pdf/AOA0000/AOA0000CE1.pdf; ComponentLink5Description: http://industrial.panasonic.com/www-data/pdf/AOA0000/AOA0000CE1.pdf; ComponentLink6URL: http://www.farnell.com/datasheets/1500035.pdf; ComponentLink6Description: http://www.farnell.com/datasheets/1500035.pdf; ComponentLink7URL: http://www.alliedelec.com/m/d/51cd0790071e1666bdb9d00c57fcf960.pdf; ComponentLink7Description: http://www.alliedelec.com/m/d/51cd0790071e1666bdb9d00c57fcf960.pdf; ComponentLink8URL: http://sigma.octopart.com/114692702/technical_drawing/TE-Connectivity-CRGCQ0603J330K.pdf; ComponentLink8Description: http://sigma.octopart.com/114692702/technical_drawing/TE-Connectivity-CRGCQ0603J330K.pdf; ComponentLink9URL: http://datasheet.octopart.com/CRGCQ0603J330K-TE-Connectivity-datasheet-114679081.pdf; ComponentLink9Description: http://datasheet.octopart.com/CRGCQ0603J330K-TE-Connectivity-datasheet-114679081.pdf; Stock 3: 0; Pricing 3: 100=0.0172, 1000=0.0073, 5000=0.00301, 15000=0.00258, 50000=0.00215 (USD); .SCHCHK: USED; Supplier 1: Digi-Key; Supplier Part Number 1: 311-330KGRCT-ND
footprint R-0603
pins: 1, 2

## R-330K-0805
designator R?, comment 330K  Case Code (Imperial): 0805
RES SMD 330K OHM 5% 1/8W 0805; Manufacturer: Stackpole Electronics; Manufacturer Part Number: RMCF0805JT330K; Resistance: 330kR; Max Power Dissipation: 125mW; Temperature Coefficient: 200ppm/°C; Voltage Rating (DC): 150V; .PCBCHK: USED; .Creator: F:TALI; Washability: OK; Stock 1: 99311; Pricing 1: 1=0.1, 10=0.021, 100=0.0086, 1000=0.00385, 2500=0.00334 (USD); Mount: Surface Mount; Case/Package: 0805; Case Code (Metric): 2012; Contact Plating: Matte,Tin; Min Operating Temperature: -55°C; Max Operating Temperature: 155°C; Packaging: Tape and Reel; Tolerance: 5%; Composition: Thick Film; Number of Terminations: 2; Package Quantity: 1; Military Standard: Not; Features: Automotive AEC-Q200; Length: 0.079inch; Height: 0.026inch; Width: 0.049inch; Depth: 1.25mm; Radiation Hardening: No; ComponentLink1URL: http://components.arrow.com/part/dataview/40965494S7077396N1174; ComponentLink1Description: http://components.arrow.com/part/dataview/40965494S7077396N1174; Stock 2: 20862; Pricing 2: 1=0.1, 10=0.059, 100=0.024, 1000=0.01079, 2500=0.00936 (USD); Lead Free: Lead Free; ComponentLink2URL: http://www.samsungsem.com/kr/support/library/product-catalog/__icsFiles/afieldfile/2015/09/22/CHIP_RESISTOR_2015.pdf; ComponentLink2Description: http://www.samsungsem.com/kr/support/library/product-catalog/__icsFiles/afieldfile/2015/09/22/CHIP_RESISTOR_2015.pdf; Stock 3: 417217; Pricing 3: 1=0.1, 10=0.061, 100=0.0249, 1000=0.0112, 2500=0.00972 (USD); Weight: 0.000194oz; Power Rating: 125mW; Voltage Rating: 150V; Termination: SMD/SMT; REACH SVHC: Unknown; ComponentLink3URL: http://www.farnell.com/datasheets/1694929.pdf; ComponentLink3Description: http://www.farnell.com/datasheets/1694929.pdf; ComponentLink4URL: https://www.alliedelec.com/m/d/51cd0790071e1666bdb9d00c57fcf960.pdf; ComponentLink4Description: https://www.alliedelec.com/m/d/51cd0790071e1666bdb9d00c57fcf960.pdf; ComponentLink5URL: http://industrial.panasonic.com/www-data/pdf/AOA0000/AOA0000CE1.pdf; ComponentLink5Description: http://industrial.panasonic.com/www-data/pdf/AOA0000/AOA0000CE1.pdf; ComponentLink6URL: http://www.farnell.com/datasheets/2059623.pdf; ComponentLink6Description: http://www.farnell.com/datasheets/2059623.pdf; ComponentLink7URL: http://components.arrow.com/part/dataview/3982596S2126274N1386; ComponentLink7Description: http://components.arrow.com/part/dataview/3982596S2126274N1386; .SCHCHK: USED; Supplier 1: Digi-Key; Supplier Part Number 1: RMCF0805JT330KCT-ND
footprint R-0805
pins: 1, 2

## R-330K-1206
designator R?, comment 330K  Max Power Dissipation: 1/4W  Case Code (Imperial): 1206
RES SMD 330K OHM 5% 1/4W 1206; Manufacturer: Panasonic; Manufacturer Part Number: ERJ-8GEYJ334V; Resistance: 330kR; Temperature Coefficient: 200ppm/°C; Power Rating: 250mW; Voltage Rating: 200V; .PCBCHK: USED; .Creator: F:TALI; Washability: OK; Stock 1: 40000; Pricing 1: 5000=0.0088, 10000=0.00764, 25000=0.00672, 50000=0.00616, 125000=0.00604 (USD); Mount: Surface Mount; Case/Package: 1206; Contact Plating: Tin; Case Code (Metric): 3216; Min Operating Temperature: -55°C; Max Operating Temperature: 155°C; Tolerance: 5%; Composition: Thick Film; Packaging: Tape and Reel; Package Quantity: 1; Number of Terminations: 2; Termination: SMD/SMT; Military Standard: Not; Voltage Rating (DC): 200V; Features: Automotive AEC-Q200; Length: 3.2mm; Height: 0.028inch; Width: 0.063inch; Depth: 1.6mm; Radiation Hardening: No; REACH SVHC: No SVHC; Lead Free: Lead Free; ComponentLink1URL: http://www.farnell.com/datasheets/2059623.pdf; ComponentLink1Description: http://www.farnell.com/datasheets/2059623.pdf; ComponentLink2URL: http://industrial.panasonic.com/www-data/pdf/AOA0000/AOA0000CE1.pdf; ComponentLink2Description: http://industrial.panasonic.com/www-data/pdf/AOA0000/AOA0000CE1.pdf; ComponentLink3URL: https://www.alliedelec.com/m/d/51cd0790071e1666bdb9d00c57fcf960.pdf; ComponentLink3Description: https://www.alliedelec.com/m/d/51cd0790071e1666bdb9d00c57fcf960.pdf; Stock 2: 48809; Pricing 2: 1=0.1, 10=0.07, 100=0.0284, 1000=0.01274, 2500=0.01106 (USD); Number of Pins: 2; ComponentLink4URL: http://www.yageo.com/documents/recent/PYu-RC_Group_51_RoHS_L_9.pdf; ComponentLink4Description: http://www.yageo.com/documents/recent/PYu-RC_Group_51_RoHS_L_9.pdf; ComponentLink5URL: http://www.yageo.com.tw/exep/pages/download/literatures/PYu-R_INT-thick_7.pdf; ComponentLink5Description: http://www.yageo.com.tw/exep/pages/download/literatures/PYu-R_INT-thick_7.pdf; ComponentLink6URL: http://www.farnell.com/datasheets/1675737.pdf; ComponentLink6Description: http://www.farnell.com/datasheets/1675737.pdf; ComponentLink7URL: http://www.farnell.com/datasheets/444357.pdf; ComponentLink7Description: http://www.farnell.com/datasheets/444357.pdf; ComponentLink8URL: http://www.yageo.com/documents/recent/PYu-RC1206_51_RoHS_L-4.pdf; ComponentLink8Description: http://www.yageo.com/documents/recent/PYu-RC1206_51_RoHS_L-4.pdf; ComponentLink9URL: https://produktinfo.conrad.com/datenblaetter/400000-424999/402842-da-01-en-SMD_Widerstand_Chip1206_330_kOhm.pdf; ComponentLink9Description: https://produktinfo.conrad.com/datenblaetter/400000-424999/402842-da-01-en-SMD_Widerstand_Chip1206_330_kOhm.pdf; Stock 3: 34798; Pricing 3: 1=0.1, 10=0.059, 100=0.0238, 1000=0.0107, 2500=0.00928 (USD); ComponentLink10URL: http://sigma.octopart.com/114713596/technical_drawing/TE-Connectivity-CRGCQ1206J330K.pdf; ComponentLink10Description: http://sigma.octopart.com/114713596/technical_drawing/TE-Connectivity-CRGCQ1206J330K.pdf; ComponentLink11URL: http://datasheet.octopart.com/CRGCQ1206J330K-TE-Connectivity-datasheet-114679081.pdf; ComponentLink11Description: http://datasheet.octopart.com/CRGCQ1206J330K-TE-Connectivity-datasheet-114679081.pdf; .SCHCHK: USED; Supplier 1: Digi-Key; Supplier Part Number 1: P330KETR-ND
footprint R-1206
pins: 1, 2

## R-330R-0402
designator R?, comment 330R  Case Code (Imperial): 0402
RES SMD 330 OHM 1% 1/10W 0402; Manufacturer: Panasonic; Manufacturer Part Number: ERJ-2RKF3300X; Temperature Coefficient: 100ppm/°C; Power Rating: 100mW; Voltage Rating: 50V; .PCBCHK: USED; .Creator: F:TALI; Washability: OK; Stock 1: 1785072; Pricing 1: 1=0.1, 10=0.045, 100=0.0183, 1000=0.00823, 2500=0.00715, 5000=0.0059 (USD); Mount: Surface Mount; Case/Package: 0402; Number of Pins: 2; Weight: 2.8E-05oz; Contact Plating: Tin; Case Code (Metric): 1005; Min Operating Temperature: -55°C; Max Operating Temperature: 155°C; Resistance: 330R; Tolerance: 1%; Composition: Thick Film; Packaging: Tape and Reel; Package Quantity: 1; Termination: SMD/SMT; Number of Terminations: 2; Military Standard: Not; Max Power Dissipation: 100mW; Voltage Rating (DC): 50V; Features: Automotive AEC-Q200; Length: 1mm; Height: 0.35mm; Width: 0.5mm; Depth: 0.5mm; Radiation Hardening: No; REACH SVHC: No SVHC; Lead Free: Lead Free; ComponentLink1URL: http://www.alliedelec.com/m/d/623f45ff1957d936ff56d46fd1c28cac.pdf; ComponentLink1Description: http://www.alliedelec.com/m/d/623f45ff1957d936ff56d46fd1c28cac.pdf; ComponentLink2URL: http://industrial.panasonic.com/www-data/pdf/AOA0000/AOA0000CE2.pdf; ComponentLink2Description: http://industrial.panasonic.com/www-data/pdf/AOA0000/AOA0000CE2.pdf; ComponentLink3URL: http://www.farnell.com/datasheets/1678782.pdf; ComponentLink3Description: http://www.farnell.com/datasheets/1678782.pdf; Stock 2: 32729; Pricing 2: 1=0.3, 10=0.254, 100=0.0993, 1000=0.04158, 2500=0.03812, 5000=0.03465 (USD); ComponentLink4URL: http://www.vishay.com/docs/28705/mc_pro.pdf; ComponentLink4Description: http://www.vishay.com/docs/28705/mc_pro.pdf; Stock 3: 1886799; Pricing 3: 1=0.1, 10=0.031, 100=0.0125, 1000=0.0056, 2500=0.00486, 5000=0.00401 (USD); ComponentLink5URL: http://www.farnell.com/datasheets/2059623.pdf; ComponentLink5Description: http://www.farnell.com/datasheets/2059623.pdf; ComponentLink6URL: http://industrial.panasonic.com/www-data/pdf/AOA0000/AOA0000CE1.pdf; ComponentLink6Description: http://industrial.panasonic.com/www-data/pdf/AOA0000/AOA0000CE1.pdf; ComponentLink7URL: http://www.farnell.com/datasheets/1678796.pdf; ComponentLink7Description: http://www.farnell.com/datasheets/1678796.pdf; ComponentLink8URL: https://www.alliedelec.com/m/d/51cd0790071e1666bdb9d00c57fcf960.pdf; ComponentLink8Description: https://www.alliedelec.com/m/d/51cd0790071e1666bdb9d00c57fcf960.pdf; ComponentLink9URL: http://www.farnell.com/datasheets/1500035.pdf; ComponentLink9Description: http://www.farnell.com/datasheets/1500035.pdf; .SCHCHK: USED; Supplier 1: Digi-Key; Supplier Part Number 1: P330LDKR-ND
footprint R-0402
pins: 1, 2

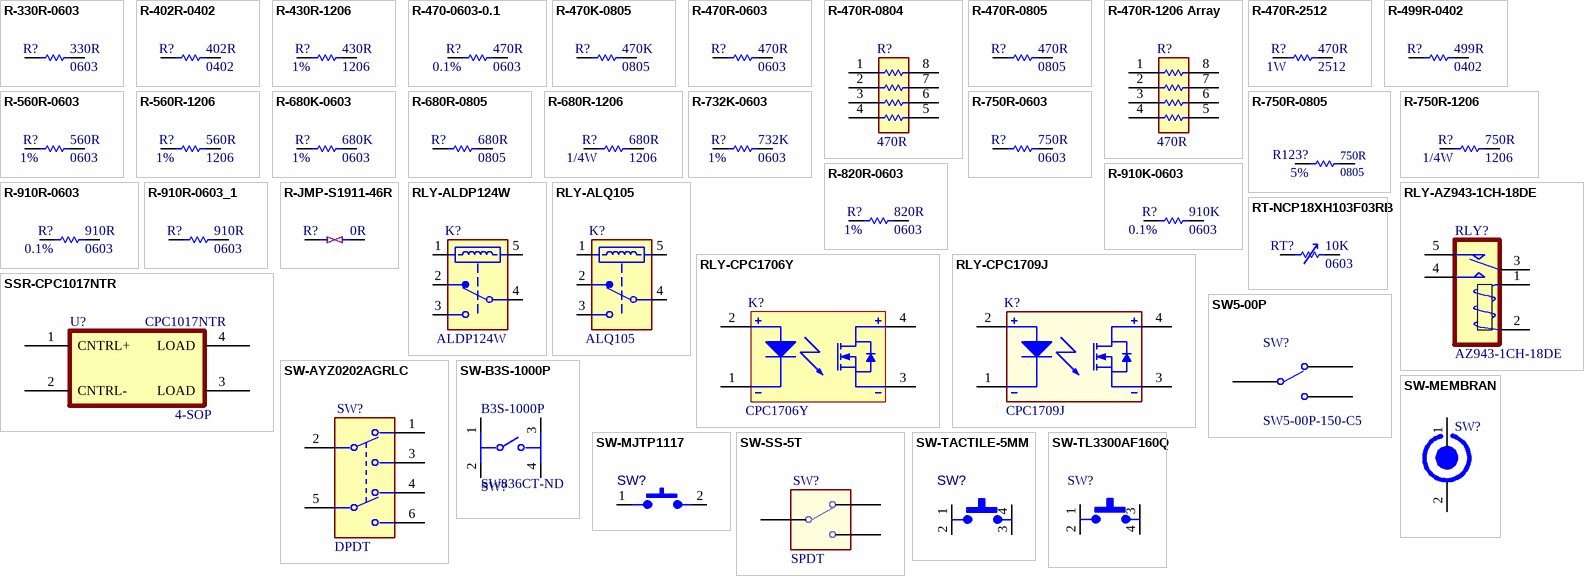
[diagram p40: symbols R-330R-0603 to SW-TL3300AF160Q]

## R-330R-0603
designator R?, comment 330R  Case Code (Imperial): 0603
RES SMD 330 OHM 5% 1/10W 0603; Manufacturer: Yageo; Manufacturer Part Number: RC0603JR-07330RL; Power Rating: 100mW; Voltage Rating (DC): 50V; Temperature Coefficient: 100ppm/°C; Working Voltage: 75V; .PCBCHK: USED; .Creator: F:TALI; Washability: OK; Stock 1: 0; Pricing 1: 1=0.1, 10=0.022, 100=0.0091, 1000=0.00429, 2500=0.00376 (USD); Case/Package: 0603; Number of Pins: 2; Case Code (Metric): 1608; Min Operating Temperature: -55°C; Max Operating Temperature: 155°C; Resistance: 330R; Tolerance: 5%; Packaging: Tape and Reel; Voltage Rating: 50V; Package Quantity: 5000; Termination: SMD/SMT; Composition: Thick Film; Military Standard: Not; Length: 1.6mm; Height: 0.45mm; Width: 0.8mm; Depth: 0.8mm; REACH SVHC: No SVHC; Lead Free: Lead Free; ComponentLink1URL: http://www.farnell.com/datasheets/1868787.pdf; ComponentLink1Description: http://www.farnell.com/datasheets/1868787.pdf; ComponentLink2URL: http://www.farnell.com/datasheets/443971.pdf; ComponentLink2Description: http://www.farnell.com/datasheets/443971.pdf; ComponentLink3URL: https://www.verical.com/server-webapp/html/getDatasheet?partID=342831; ComponentLink3Description: https://www.verical.com/server-webapp/html/getDatasheet?partID=342831; ComponentLink4URL: http://www.mouser.com/catalog/specsheets/RC0603.pdf; ComponentLink4Description: http://www.mouser.com/catalog/specsheets/RC0603.pdf; Stock 2: 185696; Pricing 2: 1=0.1, 10=0.016, 100=0.0064, 1000=0.00289, 2500=0.0025 (USD); Mount: Surface Mount; Contact Plating: Matte,Tin; Number of Terminations: 2; Max Power Dissipation: 100mW; Features: Automotive AEC-Q200; Radiation Hardening: No; Stock 3: 10218189; Pricing 3: 1=0.1, 10=0.026, 100=0.0107, 1000=0.00478, 2500=0.00415 (USD); ComponentLink5URL: http://www.yageo.com/documents/recent/PYu-RC_Group_51_RoHS_L_9.pdf; ComponentLink5Description: http://www.yageo.com/documents/recent/PYu-RC_Group_51_RoHS_L_9.pdf; ComponentLink6URL: http://www.farnell.com/datasheets/2167052.pdf; ComponentLink6Description: http://www.farnell.com/datasheets/2167052.pdf; ComponentLink7URL: http://www.farnell.com/datasheets/1686128.pdf; ComponentLink7Description: http://www.farnell.com/datasheets/1686128.pdf; ComponentLink8URL: http://documents.rs-components.com/techlib://itc_doclist_GB.htm?stockno=5046499; ComponentLink8Description: http://documents.rs-components.com/techlib://itc_doclist_GB.htm?stockno=5046499; .SCHCHK: USED; Supplier 1: Digi-Key; Supplier Part Number 1: 311-330GRCT-ND; Supplier 2: Digi-Key; Supplier Part Number 2: RMCF0603JT330RCT-ND
footprint R-0603
pins: 1, 2

## R-402R-0402
designator R?, comment 402R  Case Code (Imperial): 0402
RES SMD 402 OHM 1% 1/10W 0402; Manufacturer: Panasonic; Manufacturer Part Number: ERJ-2RKF4020X; Power Rating: 100mW; Voltage Rating: 50V; Temperature Coefficient: 100ppm/°C; .PCBCHK: USED; .Creator: F:TALI; Washability: OK; Supplier 1: Digi-Key; Supplier Part Number 1: P402LDKR-ND; Stock 1: 1247078; Pricing 1: 1=0.1, 10=0.045, 100=0.0183, 1000=0.00823, 2500=0.00715, 5000=0.0059 (USD); Mount: Surface Mount; Case/Package: 0402; Case Code (Metric): 1005; Contact Plating: Tin; Min Operating Temperature: -55°C; Max Operating Temperature: 155°C; Resistance: 402R; Tolerance: 1%; Packaging: Tape and Reel; Package Quantity: 1; Composition: Thick Film; Number of Terminations: 2; Termination: SMD/SMT; Military Standard: Not; Max Power Dissipation: 100mW; Voltage Rating (DC): 50V; Features: Automotive AEC-Q200; Length: 1mm; Height: 0.35mm; Width: 0.02inch; Depth: 0.5mm; REACH SVHC: No SVHC; Lead Free: Lead Free; ComponentLink1URL: http://www.farnell.com/datasheets/426256.pdf; ComponentLink1Description: http://www.farnell.com/datasheets/426256.pdf; ComponentLink2URL: http://www.farnell.com/datasheets/1678782.pdf; ComponentLink2Description: http://www.farnell.com/datasheets/1678782.pdf; ComponentLink3URL: http://www.mouser.com/ds/2/315/AOA0000C283-1093288.pdf; ComponentLink3Description: http://www.mouser.com/ds/2/315/AOA0000C283-1093288.pdf; ComponentLink4URL: https://industrial.panasonic.com/cdbs/www-data/pdf/RDA0000/DMA0000COL11.pdf; ComponentLink4Description: https://industrial.panasonic.com/cdbs/www-data/pdf/RDA0000/DMA0000COL11.pdf; ComponentLink5URL: http://industrial.panasonic.com/www-data/pdf/AOA0000/AOA0000CE2.pdf; ComponentLink5Description: http://industrial.panasonic.com/www-data/pdf/AOA0000/AOA0000CE2.pdf; .SCHCHK: USED
footprint R-0402
pins: 1, 2

## R-430R-1206
designator R?, comment 430R  Tolerance: 1%  Case/Package: 1206